# Altium footprint library WR-TBL_Pluggable PCB Header.PcbLib: 719 footprints (part 6 of 45)
Each footprint in its own frame and in the unit in brackets; x right, y up, seen from the top. Pads: shape width x height; smd on the part's side, far side on the other; paste and mask are expansions set on the pad; w line width, h text height; cw(c..) or ccw(c..) is an arc to the next point about the centre after c.
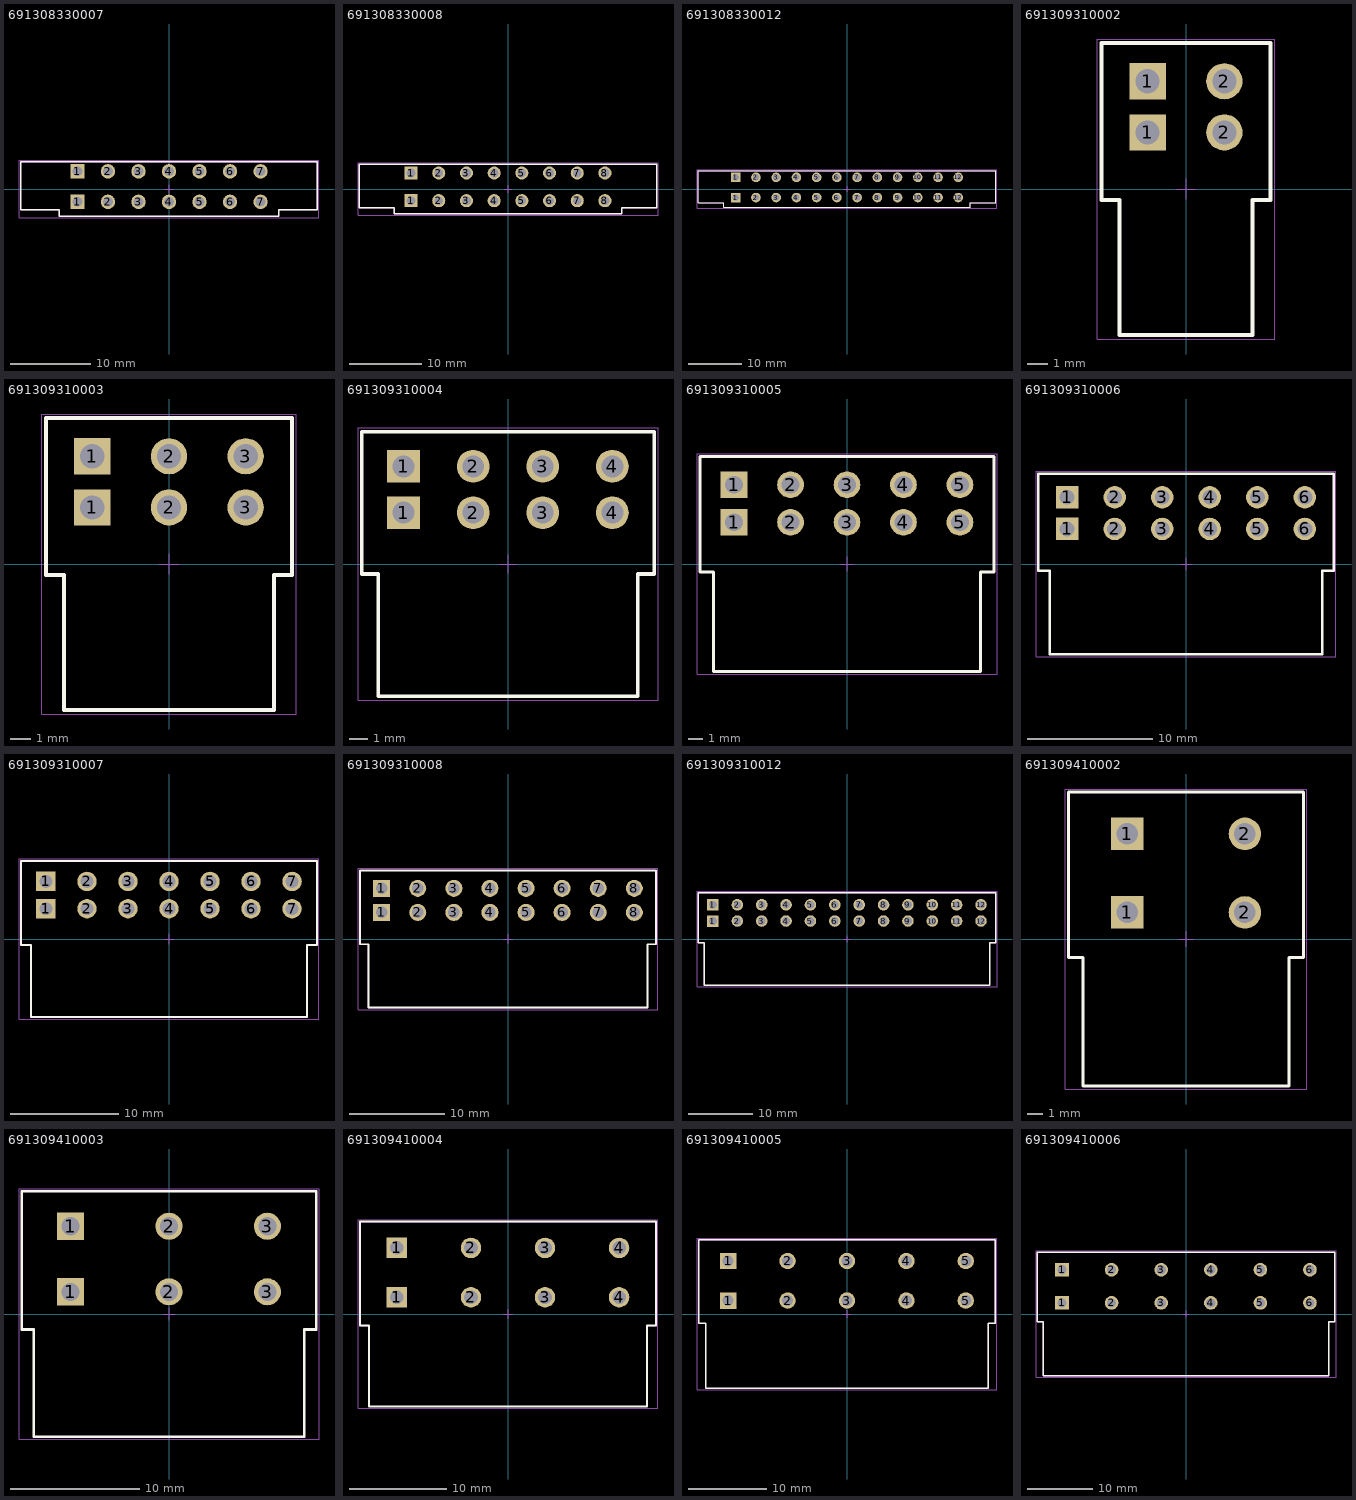
[diagram p5: the footprints below, top view; thin cyan lines are the x and y axes]

## 691308330007 [mm] "Vertical Reserved PCB Header with Flanges, pitch 3.81mm, 07p"
height 14.5
pads (14):
  rect 1.8x1.8 hole 1.2: 1(-11.43,-1.61) 1(-11.43,2.2)
  round 1.8 hole 1.2: 2(-7.62,-1.61) 2(-7.62,2.2) 3(-3.81,-1.61) 3(-3.81,2.2) 4(0,-1.61) 4(0,2.2) 5(3.81,-1.61) 5(3.81,2.2) 6(7.62,-1.61) 6(7.62,2.2) 7(11.43,-1.61) 7(11.43,2.2)
Top Overlay:
  lines w0.2: -18.53,-2.6 -18.53,3.4 18.53,3.4 18.53,-2.6 13.725,-2.6 13.725,-3.4 -13.725,-3.4 -13.725,-2.6 -18.53,-2.6
Mechanical 13:
  lines w0.1: -18.53,-2.6 -13.725,-2.6 -13.725,-3.4 13.725,-3.4 13.725,-2.6 18.53,-2.6 18.53,3.4 -18.53,3.4 -18.53,-2.6
Mechanical 15:
  lines w0.05: -0.5,0 0.5,0 ; 0,-0.5 0,0.5 ; -18.73,-3.6 -18.73,3.6 18.73,3.6 18.73,-3.6 -18.73,-3.6
3D body "691308330007.stp": height 14.6, standoff -3.3, extent -18.53,-3.4 18.53,3.4

## 691308330008 [mm] "Vertical Reserved PCB Header with Flanges, pitch 3.81mm, 08p"
height 14.5
pads (16):
  rect 1.8x1.8 hole 1.2: 1(-13.335,-1.61) 1(-13.335,2.2)
  round 1.8 hole 1.2: 2(-9.525,-1.61) 2(-9.525,2.2) 3(-5.715,-1.61) 3(-5.715,2.2) 4(-1.905,-1.61) 4(-1.905,2.2) 5(1.905,-1.61) 5(1.905,2.2) 6(5.715,-1.61) 6(5.715,2.2) 7(9.525,-1.61) 7(9.525,2.2) 8(13.335,-1.61) 8(13.335,2.2)
Top Overlay:
  lines w0.2: -20.435,-2.6 -20.435,3.4 20.435,3.4 20.435,-2.6 15.63,-2.6 15.63,-3.4 -15.63,-3.4 -15.63,-2.6 -20.435,-2.6
Mechanical 13:
  lines w0.1: -20.435,-2.6 -15.63,-2.6 -15.63,-3.4 15.63,-3.4 15.63,-2.6 20.435,-2.6 20.435,3.4 -20.435,3.4 -20.435,-2.6
Mechanical 15:
  lines w0.05: -0.5,0 0.5,0 ; 0,-0.5 0,0.5 ; -20.635,-3.6 -20.635,3.6 20.635,3.6 20.635,-3.6 -20.635,-3.6
3D body "691308330008.stp": height 14.6, standoff -3.3, extent -20.435,-3.4 20.435,3.4

## 691308330012 [mm] "Vertical Reserved PCB Header with Flanges, pitch 3.81mm, 12p"
height 14.5
pads (24):
  rect 1.8x1.8 hole 1.2: 1(-20.955,-1.61) 1(-20.955,2.2)
  round 1.8 hole 1.2: 2(-17.145,-1.61) 2(-17.145,2.2) 3(-13.335,-1.61) 3(-13.335,2.2) 4(-9.525,-1.61) 4(-9.525,2.2) 5(-5.715,-1.61) 5(-5.715,2.2) 6(-1.905,-1.61) 6(-1.905,2.2) 7(1.905,-1.61) 7(1.905,2.2) 8(5.715,-1.61) 8(5.715,2.2) 9(9.525,-1.61) 9(9.525,2.2) 10(13.335,-1.61) 10(13.335,2.2) 11(17.145,-1.61) 11(17.145,2.2) 12(20.955,-1.61) 12(20.955,2.2)
Top Overlay:
  lines w0.2: -28.055,-2.6 -23.25,-2.6 -23.25,-3.4 23.25,-3.4 23.25,-2.6 28.055,-2.6 28.055,3.4 -28.055,3.4 -28.055,-2.6
Mechanical 13:
  lines w0.1: -28.055,-2.6 -28.055,3.4 28.055,3.4 28.055,-2.6 23.25,-2.6 23.25,-3.4 -23.25,-3.4 -23.25,-2.6 -28.055,-2.6
Mechanical 15:
  lines w0.05: -0.5,0 0.5,0 ; 0,-0.5 0,0.5 ; -28.255,-3.6 28.255,-3.6 28.255,3.6 -28.255,3.6 -28.255,-3.6
3D body "691308330012.stp": height 14.6, standoff -3.3, extent -28.055,-3.4 28.055,3.4

## 691309310002 [mm] "Horizontal Reserved PCB Header, pitch 3.81mm, 02p"
height 6.6
pads (4):
  rect 1.8x1.8 hole 1.2: 1(-1.905,2.81) 1(-1.905,5.35)
  round 1.8 hole 1.2: 2(1.905,2.81) 2(1.905,5.35)
Top Overlay:
  lines w0.2: -4.205,-0.55 -4.205,7.25 4.205,7.25 4.205,-0.55 3.305,-0.55 3.305,-7.25 -3.305,-7.25 -3.305,-0.55 -4.205,-0.55
Mechanical 13:
  lines w0.1: -4.205,-0.55 -3.305,-0.55 -3.305,-7.25 3.305,-7.25 3.305,-0.55 4.205,-0.55 4.205,7.25 -4.205,7.25 -4.205,-0.55
Mechanical 15:
  lines w0.05: -0.5,0 0.5,0 ; 0,-0.5 0,0.5 ; -4.405,-7.45 4.405,-7.45 4.405,7.45 -4.405,7.45 -4.405,-7.45
3D body "691309310002.stp": height 6.85, standoff -3.35, extent -4.205,-7.25 4.205,7.25

## 691309310003 [mm] "Horizontal Reserved PCB Header, pitch 3.81mm, 03p"
height 6.6
pads (6):
  rect 1.8x1.8 hole 1.2: 1(-3.81,2.81) 1(-3.81,5.35)
  round 1.8 hole 1.2: 2(0,2.81) 2(0,5.35) 3(3.81,2.81) 3(3.81,5.35)
Top Overlay:
  lines w0.2: -6.11,-0.55 -5.21,-0.55 -5.21,-7.25 5.21,-7.25 5.21,-0.55 6.11,-0.55 6.11,7.25 -6.11,7.25 -6.11,-0.55
Mechanical 13:
  lines w0.1: -6.11,-0.55 -6.11,7.25 6.11,7.25 6.11,-0.55 5.21,-0.55 5.21,-7.25 -5.21,-7.25 -5.21,-0.55 -6.11,-0.55
Mechanical 15:
  lines w0.05: -0.5,0 0.5,0 ; 0,-0.5 0,0.5 ; -6.31,-7.45 -6.31,7.45 6.31,7.45 6.31,-7.45 -6.31,-7.45
3D body "691309310003.stp": height 6.85, standoff -3.35, extent -6.11,-7.25 6.11,7.25

## 691309310004 [mm] "Horizontal Reserved PCB Header, pitch 3.81mm, 04p"
height 6.6
pads (8):
  rect 1.8x1.8 hole 1.2: 1(-5.715,2.81) 1(-5.715,5.35)
  round 1.8 hole 1.2: 2(-1.905,2.81) 2(-1.905,5.35) 3(1.905,2.81) 3(1.905,5.35) 4(5.715,2.81) 4(5.715,5.35)
Top Overlay:
  lines w0.2: -8.015,-0.55 -8.015,7.25 8.015,7.25 8.015,-0.55 7.115,-0.55 7.115,-7.25 -7.115,-7.25 -7.115,-0.55 -8.015,-0.55
Mechanical 13:
  lines w0.1: -8.015,-0.55 -7.115,-0.55 -7.115,-7.25 7.115,-7.25 7.115,-0.55 8.015,-0.55 8.015,7.25 -8.015,7.25 -8.015,-0.55
Mechanical 15:
  lines w0.05: -0.5,0 0.5,0 ; 0,-0.5 0,0.5 ; -8.215,-7.45 8.215,-7.45 8.215,7.45 -8.215,7.45 -8.215,-7.45
3D body "691309310004.stp": height 6.85, standoff -3.35, extent -8.015,-7.25 8.015,7.25

## 691309310005 [mm] "Horizontal Reserved PCB Header, pitch 3.81mm, 05p"
height 6.6
pads (10):
  rect 1.8x1.8 hole 1.2: 1(-7.62,2.81) 1(-7.62,5.35)
  round 1.8 hole 1.2: 2(-3.81,2.81) 2(-3.81,5.35) 3(0,2.81) 3(0,5.35) 4(3.81,2.81) 4(3.81,5.35) 5(7.62,2.81) 5(7.62,5.35)
Top Overlay:
  lines w0.2: -9.92,-0.55 -9.02,-0.55 -9.02,-7.25 9.02,-7.25 9.02,-0.55 9.92,-0.55 9.92,7.25 -9.92,7.25 -9.92,-0.55
Mechanical 13:
  lines w0.1: -9.92,-0.55 -9.92,7.25 9.92,7.25 9.92,-0.55 9.02,-0.55 9.02,-7.25 -9.02,-7.25 -9.02,-0.55 -9.92,-0.55
Mechanical 15:
  lines w0.05: -0.5,0 0.5,0 ; 0,-0.5 0,0.5 ; -10.12,-7.45 -10.12,7.45 10.12,7.45 10.12,-7.45 -10.12,-7.45
3D body "691309310005.stp": height 6.85, standoff -3.35, extent -9.92,-7.25 9.92,7.25

## 691309310006 [mm] "Horizontal Reserved PCB Header, pitch 3.81mm, 06p"
height 6.6
pads (12):
  rect 1.8x1.8 hole 1.2: 1(-9.525,2.81) 1(-9.525,5.35)
  round 1.8 hole 1.2: 2(-5.715,2.81) 2(-5.715,5.35) 3(-1.905,2.81) 3(-1.905,5.35) 4(1.905,2.81) 4(1.905,5.35) 5(5.715,2.81) 5(5.715,5.35) 6(9.525,2.81) 6(9.525,5.35)
Top Overlay:
  lines w0.2: -11.825,-0.55 -10.925,-0.55 -10.925,-7.25 10.925,-7.25 10.925,-0.55 11.825,-0.55 11.825,7.25 -11.825,7.25 -11.825,-0.55
Mechanical 13:
  lines w0.1: -11.825,-0.55 -11.825,7.25 11.825,7.25 11.825,-0.55 10.925,-0.55 10.925,-7.25 -10.925,-7.25 -10.925,-0.55 -11.825,-0.55
Mechanical 15:
  lines w0.05: -0.5,0 0.5,0 ; 0,-0.5 0,0.5 ; -12.025,-7.45 -12.025,7.45 12.025,7.45 12.025,-7.45 -12.025,-7.45
3D body "691309310006.stp": height 6.85, standoff -3.35, extent -11.825,-7.25 11.825,7.25

## 691309310007 [mm] "Horizontal Reserved PCB Header, pitch 3.81mm, 07p"
height 6.6
pads (14):
  rect 1.8x1.8 hole 1.2: 1(-11.43,2.81) 1(-11.43,5.35)
  round 1.8 hole 1.2: 2(-7.62,2.81) 2(-7.62,5.35) 3(-3.81,2.81) 3(-3.81,5.35) 4(0,2.81) 4(0,5.35) 5(3.81,2.81) 5(3.81,5.35) 6(7.62,2.81) 6(7.62,5.35) 7(11.43,2.81) 7(11.43,5.35)
Top Overlay:
  lines w0.2: -13.73,-0.55 -12.83,-0.55 -12.83,-7.25 12.83,-7.25 12.83,-0.55 13.73,-0.55 13.73,7.25 -13.73,7.25 -13.73,-0.55
Mechanical 13:
  lines w0.1: -13.73,-0.55 -13.73,7.25 13.73,7.25 13.73,-0.55 12.83,-0.55 12.83,-7.25 -12.83,-7.25 -12.83,-0.55 -13.73,-0.55
Mechanical 15:
  lines w0.05: -0.5,0 0.5,0 ; 0,-0.5 0,0.5 ; -13.93,-7.45 -13.93,7.45 13.93,7.45 13.93,-7.45 -13.93,-7.45
3D body "691309310007.stp": height 6.85, standoff -3.35, extent -13.73,-7.25 13.73,7.25

## 691309310008 [mm] "Horizontal Reserved PCB Header, pitch 3.81mm, 08p"
height 6.6
pads (16):
  rect 1.8x1.8 hole 1.2: 1(-13.335,2.81) 1(-13.335,5.35)
  round 1.8 hole 1.2: 2(-9.525,2.81) 2(-9.525,5.35) 3(-5.715,2.81) 3(-5.715,5.35) 4(-1.905,2.81) 4(-1.905,5.35) 5(1.905,2.81) 5(1.905,5.35) 6(5.715,2.81) 6(5.715,5.35) 7(9.525,2.81) 7(9.525,5.35) 8(13.335,2.81) 8(13.335,5.35)
Top Overlay:
  lines w0.2: -15.635,-0.55 -15.635,7.25 15.635,7.25 15.635,-0.55 14.735,-0.55 14.735,-7.25 -14.735,-7.25 -14.735,-0.55 -15.635,-0.55
Mechanical 13:
  lines w0.1: -15.635,-0.55 -14.735,-0.55 -14.735,-7.25 14.735,-7.25 14.735,-0.55 15.635,-0.55 15.635,7.25 -15.635,7.25 -15.635,-0.55
Mechanical 15:
  lines w0.05: -0.5,0 0.5,0 ; 0,-0.5 0,0.5 ; -15.835,-7.45 15.835,-7.45 15.835,7.45 -15.835,7.45 -15.835,-7.45
3D body "691309310008.stp": height 6.85, standoff -3.35, extent -15.635,-7.25 15.635,7.25

## 691309310012 [mm] "Horizontal Reserved PCB Header, pitch 3.81mm, 12p"
height 6.6
pads (24):
  rect 1.8x1.8 hole 1.2: 1(-20.955,2.81) 1(-20.955,5.35)
  round 1.8 hole 1.2: 2(-17.145,2.81) 2(-17.145,5.35) 3(-13.335,2.81) 3(-13.335,5.35) 4(-9.525,2.81) 4(-9.525,5.35) 5(-5.715,2.81) 5(-5.715,5.35) 6(-1.905,2.81) 6(-1.905,5.35) 7(1.905,2.81) 7(1.905,5.35) 8(5.715,2.81) 8(5.715,5.35) 9(9.525,2.81) 9(9.525,5.35) 10(13.335,2.81) 10(13.335,5.35) 11(17.145,2.81) 11(17.145,5.35) 12(20.955,2.81) 12(20.955,5.35)
Top Overlay:
  lines w0.2: -23.255,-0.55 -22.355,-0.55 -22.355,-7.25 22.355,-7.25 22.355,-0.55 23.255,-0.55 23.255,7.25 -23.255,7.25 -23.255,-0.55
Mechanical 13:
  lines w0.1: -23.255,-0.55 -23.255,7.25 23.255,7.25 23.255,-0.55 22.355,-0.55 22.355,-7.25 -22.355,-7.25 -22.355,-0.55 -23.255,-0.55
Mechanical 15:
  lines w0.05: -0.5,0 0.5,0 ; 0,-0.5 0,0.5 ; -23.455,-7.45 -23.455,7.45 23.455,7.45 23.455,-7.45 -23.455,-7.45
3D body "691309310012.stp": height 6.85, standoff -3.35, extent -23.255,-7.25 23.255,7.25

## 691309410002 [mm] "7.62 mm - Reversed Gender Horizontal PCB Header - 02p"
height 8.6
pads (4):
  rect 2.1x2.1 hole 1.4: 1(-3.81,1.72) 1(-3.81,6.8)
  round 2.1 hole 1.4: 2(3.81,1.72) 2(3.81,6.8)
Top Overlay:
  lines w0.2: -7.61,-1.2 -6.67,-1.2 -6.67,-9.5 6.67,-9.5 6.67,-1.2 7.61,-1.2 7.61,9.5 -7.61,9.5 -7.61,-1.2
Mechanical 13:
  lines w0.1: -7.61,-1.2 -7.61,9.5 7.61,9.5 7.61,-1.2 6.67,-1.2 6.67,-9.5 -6.67,-9.5 -6.67,-1.2 -7.61,-1.2
Mechanical 15:
  lines w0.05: -0.5,0 0.5,0 ; 0,-0.5 0,0.5 ; -7.81,-9.7 7.81,-9.7 7.81,9.7 -7.81,9.7 -7.81,-9.7
3D body "691309410002.stp": height 10.8, standoff -3.45, extent -7.61,-9.5 7.61,9.5

## 691309410003 [mm] "7.62 mm - Reversed Gender Horizontal PCB Header - 03p"
height 8.6
pads (6):
  rect 2.1x2.1 hole 1.4: 1(-7.62,1.72) 1(-7.62,6.8)
  round 2.1 hole 1.4: 2(0,1.72) 2(0,6.8) 3(7.62,1.72) 3(7.62,6.8)
Top Overlay:
  lines w0.2: -11.42,-1.2 -11.42,9.5 11.42,9.5 11.42,-1.2 10.48,-1.2 10.48,-9.5 -10.48,-9.5 -10.48,-1.2 -11.42,-1.2
Mechanical 13:
  lines w0.1: -11.42,-1.2 -10.48,-1.2 -10.48,-9.5 10.48,-9.5 10.48,-1.2 11.42,-1.2 11.42,9.5 -11.42,9.5 -11.42,-1.2
Mechanical 15:
  lines w0.05: -0.5,0 0.5,0 ; 0,-0.5 0,0.5 ; -11.62,-9.7 -11.62,9.7 11.62,9.7 11.62,-9.7 -11.62,-9.7
3D body "691309410003.stp": height 10.8, standoff -3.45, extent -11.42,-9.5 11.42,9.5

## 691309410004 [mm] "7.62 mm - Reversed Gender Horizontal PCB Header - 04p"
height 8.6
pads (8):
  rect 2.1x2.1 hole 1.4: 1(-11.43,1.72) 1(-11.43,6.8)
  round 2.1 hole 1.4: 2(-3.81,1.72) 2(-3.81,6.8) 3(3.81,1.72) 3(3.81,6.8) 4(11.43,1.72) 4(11.43,6.8)
Top Overlay:
  lines w0.2: -15.23,-1.2 -15.23,9.5 15.23,9.5 15.23,-1.2 14.29,-1.2 14.29,-9.5 -14.29,-9.5 -14.29,-1.2 -15.23,-1.2
Mechanical 13:
  lines w0.1: -15.23,-1.2 -14.29,-1.2 -14.29,-9.5 14.29,-9.5 14.29,-1.2 15.23,-1.2 15.23,9.5 -15.23,9.5 -15.23,-1.2
Mechanical 15:
  lines w0.05: -0.5,0 0.5,0 ; 0,-0.5 0,0.5 ; -15.43,-9.7 -15.43,9.7 15.43,9.7 15.43,-9.7 -15.43,-9.7
3D body "691309410004.stp": height 10.8, standoff -3.45, extent -15.23,-9.5 15.23,9.5

## 691309410005 [mm] "7.62 mm - Reversed Gender Horizontal PCB Header - 05p"
height 8.6
pads (10):
  rect 2.1x2.1 hole 1.4: 1(-15.24,1.72) 1(-15.24,6.8)
  round 2.1 hole 1.4: 2(-7.62,1.72) 2(-7.62,6.8) 3(0,1.72) 3(0,6.8) 4(7.62,1.72) 4(7.62,6.8) 5(15.24,1.72) 5(15.24,6.8)
Top Overlay:
  lines w0.2: -19.04,-1.2 -18.1,-1.2 -18.1,-9.5 18.1,-9.5 18.1,-1.2 19.04,-1.2 19.04,9.5 -19.04,9.5 -19.04,-1.2
Mechanical 13:
  lines w0.1: -19.04,-1.2 -19.04,9.5 19.04,9.5 19.04,-1.2 18.1,-1.2 18.1,-9.5 -18.1,-9.5 -18.1,-1.2 -19.04,-1.2
Mechanical 15:
  lines w0.05: -0.5,0 0.5,0 ; 0,-0.5 0,0.5 ; -19.24,-9.7 19.24,-9.7 19.24,9.7 -19.24,9.7 -19.24,-9.7
3D body "691309410005.stp": height 10.8, standoff -3.45, extent -19.04,-9.5 19.04,9.5

## 691309410006 [mm] "7.62 mm - Reversed Gender Horizontal PCB Header - 06p"
height 8.6
pads (12):
  rect 2.1x2.1 hole 1.4: 1(-19.05,1.72) 1(-19.05,6.8)
  round 2.1 hole 1.4: 2(-11.43,1.72) 2(-11.43,6.8) 3(-3.81,1.72) 3(-3.81,6.8) 4(3.81,1.72) 4(3.81,6.8) 5(11.43,1.72) 5(11.43,6.8) 6(19.05,1.72) 6(19.05,6.8)
Top Overlay:
  lines w0.2: -22.85,-1.2 -22.85,9.5 22.85,9.5 22.85,-1.2 21.91,-1.2 21.91,-9.5 -21.91,-9.5 -21.91,-1.2 -22.85,-1.2
Mechanical 13:
  lines w0.1: -22.85,-1.2 -21.91,-1.2 -21.91,-9.5 21.91,-9.5 21.91,-1.2 22.85,-1.2 22.85,9.5 -22.85,9.5 -22.85,-1.2
Mechanical 15:
  lines w0.05: -0.5,0 0.5,0 ; 0,-0.5 0,0.5 ; -23.05,-9.7 -23.05,9.7 23.05,9.7 23.05,-9.7 -23.05,-9.7
3D body "691309410006.stp": height 10.8, standoff -3.45, extent -22.85,-9.5 22.85,9.5